# Altium footprint library Lib_001.PcbLib: 429 footprints (part 6 of 28)
Each footprint in its own frame and in the unit in brackets; x right, y up, seen from the top. Pads: shape width x height; smd on the part's side, far side on the other; paste and mask are expansions set on the pad; w line width, h text height; cw(c..) or ccw(c..) is an arc to the next point about the centre after c.
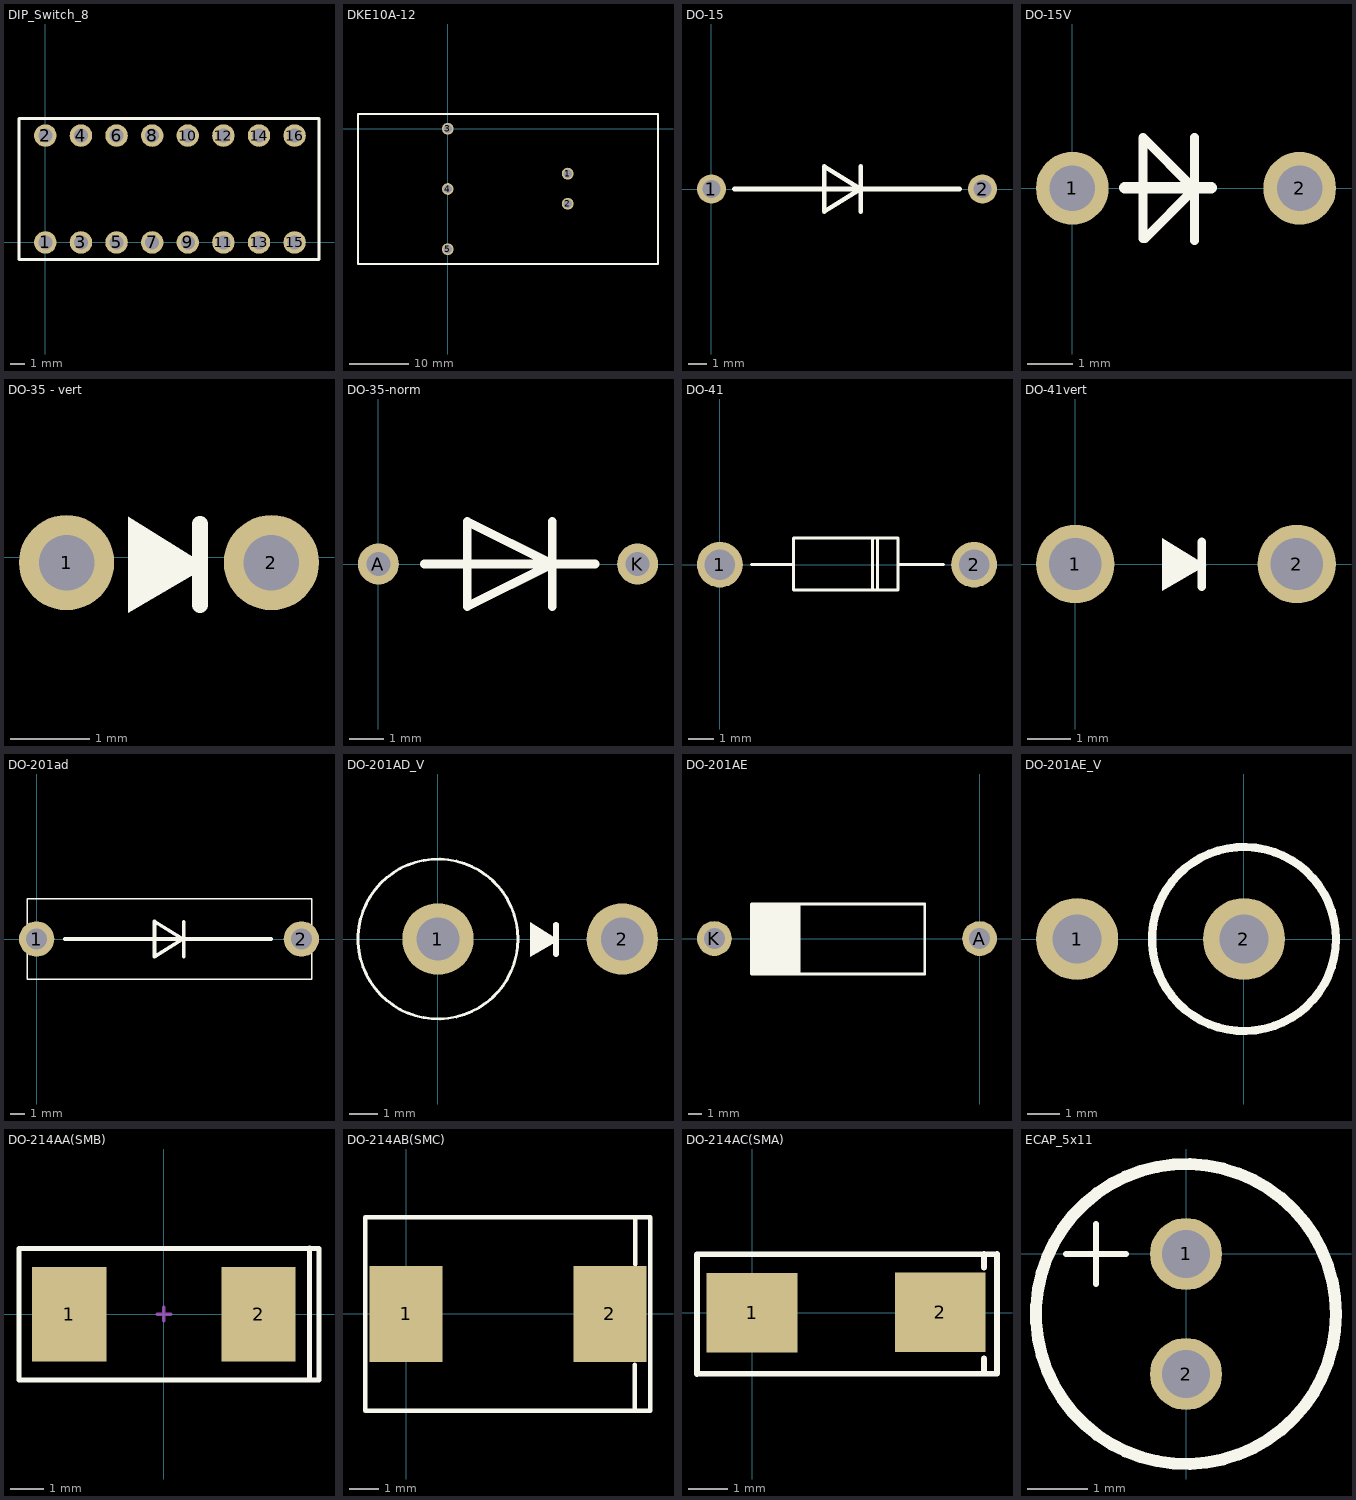
[diagram p5: the footprints below, top view; thin cyan lines are the x and y axes]

## DIP_Switch_8 [mm]
pads (16):
  round 1.6 hole 1: 1(0,0) 2(0,7.62) 3(2.54,0) 4(2.54,7.62) 5(5.08,0) 6(5.08,7.62) 7(7.62,0) 8(7.62,7.62) 9(10.16,0) 10(10.16,7.62) 11(12.7,0) 12(12.7,7.62) 13(15.24,0) 14(15.24,7.62) 15(17.78,0) 16(17.78,7.62)
Top Overlay:
  lines w0.2: -1.88,-1.22 19.52,-1.22 19.52,8.84 -1.88,8.84 -1.88,-1.22
3D body "User Library-DIP-Switch.step": height 7, standoff -3.7, extent -1.84,-1.1 19.48,8.8

## DKE10A-12 [mm]
pads (5):
  round 2 hole 1.4: 1(20.31,-7.6) 2(20.31,-12.7) 3(0,0) 4(0,-10.2) 5(0,-20.4)
Top Overlay:
  lines w0.3: 35.6,-22.9 0,-22.9 -15.2,-22.9 -15.2,2.5 0,2.5 35.6,2.5 ; 35.6,-22.88 35.6,0 35.6,2.49
3D body "User Library-DKE10B-24.step": height 12.27, standoff -4.8, extent -15.88,-23.38 35.6,2.54

## DO-15 [mm] "D1,S2,R15"
pads (2):
  round 1.6 hole 1: 1(0,0) 2(15,0)
Top Overlay:
  lines w0.254: 1.25,0 13.75,0 ; 8.25,-1.25 8.25,1.25 ; 6.25,-1.25 6.25,1.25 8.25,0 6.25,-1.25
3D body "User Library-DO-15-60.STEP": height 3.53, standoff -2, extent -0.645,-1.797 15.645,1.7

## DO-15V [mm] "D1,S2,R15"
pads (2):
  round 1.6 hole 1: 1(0,0) 2(5,0)
Top Overlay:
  lines w0.2: 2.686,-1.151 2.686,-0.016 ; 2.686,1.119 2.686,-0.016 ; 2.686,-0.016 1.6,-1.102 1.558,-1.102 1.558,1.112 2.686,-0.016
  lines w0.254: 1.148,0.016 3.054,0.016
3D body "User Library-DO-15-Vertical_100.STEP": height 12.05, standoff -3, extent -1.003,-1.764 3.747,1.796

## DO-35 - vert [mm]
pads (2):
  round 1.2 hole 0.7: 1(4.945,-0.065) 2(7.526,-0.065)
Top Overlay:
  region: 5.725,0.513 5.725,-0.7 6.725,-0.112
  lines w0.2: 6.625,-0.6 6.625,0.425
3D body "User Library-1N4148_Stand_V2008.step": height 5.52, standoff -1, extent 4.133,-0.89 7.713,0.76

## DO-35-norm [mm]
pads (2):
  round 1.2 hole 0.7: A(0,0) K(7.6,0)
Top Overlay:
  lines w0.254: 1.35,0 6.35,0 ; 5.1,-1.25 5.1,1.25 ; 2.6,-1.25 2.6,1.25 5.1,0 2.6,-1.25
3D body "User Library-DO-204AH (DO-35).step": height 2.21, standoff -1.8, extent -0.3,-1 7.84,1.02

## DO-41 [mm]
pads (2):
  round 1.8 hole 1.2: 1(0,0) 2(10,0)
Top Overlay:
  lines w0.125: 1.25,0 2.9,0 ; 6,-1 6,1 ; 6.2,-1 6.2,1 ; 7,0 8.8,0 ; 2.9,-1 7,-1 7,1.05 2.9,1.05 2.9,-1
3D body "User Library-DO-41 10mm.STEP": height 4.36, standoff -1, extent -0.41,-1.362 10.45,1.363

## DO-41vert [mm]
pads (2):
  round 1.8 hole 1.2: 1(0,0) 2(5.08,0)
Top Overlay:
  region: 2,0.594 2,-0.619 3,-0.031
  lines w0.2: 2.9,-0.519 2.9,0.506
3D body "DO-41_5.08r.STEP": height 6.46, standoff -0.6, extent -0.418,-1.225 6.268,1.285

## DO-201ad [mm] "D1.5,S2.5,R17.5"
pads (2):
  round 2.5 hole 1.5: 1(0,0) 2(18.75,0)
Top Overlay:
  lines w0.1: -0.675,-2.85 -0.675,2.85 4.9,2.85 13.025,2.85 19.475,2.85 19.475,-2.85 13.025,-2.85 4.9,-2.85 -0.675,-2.85
  lines w0.254: 2,0 16.62,0 ; 10.41,-1.27 10.41,1.23 ; 8.35,-1.26 8.35,1.24 10.35,-0.01 8.35,-1.26
3D body "User Library-DO-201ADDO-27.step": height 5.82, standoff -3.8, extent -0.67,-2.795 19.47,2.845

## DO-201AD_V [mm]
height 100
pads (2):
  round 2.5 hole 1.5: 1(0,0) 2(6.455,0)
Top Overlay:
  circle w0.1: c0,0 r2.8
  region: 3.23,0.588 3.23,-0.625 4.23,-0.038
  lines w0.2: 4.13,-0.525 4.13,0.5
3D body "User Library-User Library-DO-201AV-Vertical_2001.STEP": height 15.69, standoff -3, extent -2.8,-2.8 7.09,2.8

## DO-201AE [mm]
height 5
pads (2):
  round 2.5 hole 1.5: A(0,0) K(-19.05,0)
Top Overlay:
  rectangle: -16.383,-2.54 -12.852,2.47
  lines w0.203: -16.383,-2.54 -16.383,2.47 -3.937,2.47 -3.937,-2.54 -16.383,-2.54
3D body "DO-201AE.step": height 8.5, standoff -1.28, extent -19.542,-2.54 0.508,2.47

## DO-201AE_V [mm]
height 100
pads (2):
  round 2.5 hole 1.5: 1(-5.08,0) 2(0,0)
Top Overlay:
  circle w0.254: c0,0 r2.8
3D body "User Library-Diod DO-201AD Vertical.STEP": height 16.19, standoff -2.5, extent -5.74,-2.805 2.805,2.805

## DO-214AA(SMB) [mm]
pads (2):
  rect 2.2x2.8 smd: 1(-2.8,0) 2(2.8,0)
Top Overlay:
  lines w0.15: 4.31,-1.95 4.31,1.96 ; -4.29,-1.95 0,-1.95 4.59,-1.95 4.59,1.95 0,1.95 -4.29,1.95 -4.29,-1.95
Mechanical 1:
  lines w0.1: -0.2,0 0.2,0 ; 0,-0.2 0,0.2
3D body "User Library-DO-214AA(SMB).step": height 2.8, standoff 0.15, extent -2.994,-1.975 2.594,1.975

## DO-214AB(SMC) [mm]
height 2.45
pads (2):
  rect 2.5x3.3 smd: 1(0,0) 2(7,0)
Top Overlay:
  lines w0.152: -1.399,1.199 -1.399,-0.318 ; 7.85,-3.29 7.85,-1.747 ; 7.87,1.71 7.87,3.253 ; -1.399,-0.318 -1.399,-3.32 8.38,-3.32 8.38,3.31 -1.399,3.31 -1.399,-0.318
3D body "User Library-DO-214AB(SMC).step": height 2.77, standoff 0.13, extent -0.614,-3.1 7.514,3.2

## DO-214AC(SMA) [mm]
height 2.45
pads (2):
  rect 2.286x2 smd: 1(-0.01,0) 2(4.74,0.01)
Top Overlay:
  lines w0.152: -1.399,1.199 -1.399,-0.318 ; 5.842,-1.536 5.842,-1.151 ; 5.842,1.14 5.842,1.48 ; -1.399,-0.318 -1.399,-1.545 6.167,-1.535 6.167,1.484 -1.399,1.474 -1.399,-0.318
3D body "User Library-DO-214AC(SMA).step": height 2.44, standoff 0.16, extent -0.393,-1.41 5.093,1.384

## ECAP_5x11 [mm]
height 11
pads (2):
  round 1.2 hole 0.8: 1(0,0) 2(0,-2)
Top Overlay:
  circle w0.2: c0,-1 r2.5
  lines w0.1: -2,0 -1,0 ; -1.5,-0.5 -1.5,0.5
3D body: height 11.1, standoff 11, extent -1.984,-2.996 2,0.996
3D body: height 11, standoff 2, extent -2.48,-3.495 2.5,1.495
3D body: height 2, standoff 1, extent -1.984,-2.996 2,0.996
3D body: height 1, standoff 0, extent -2.48,-3.495 2.5,1.495
3D body: height 1, standoff -2, extent -0.248,-2.249 0.25,-1.75
3D body: height 1, standoff -2, extent -0.248,-0.249 0.25,0.25